# Altium footprint library E-Stall_lib.PcbLib: 112 footprints (part 4 of 7)
Each footprint in its own frame and in the unit in brackets; x right, y up, seen from the top. Pads: shape width x height; smd on the part's side, far side on the other; paste and mask are expansions set on the pad; w line width, h text height; cw(c..) or ccw(c..) is an arc to the next point about the centre after c.
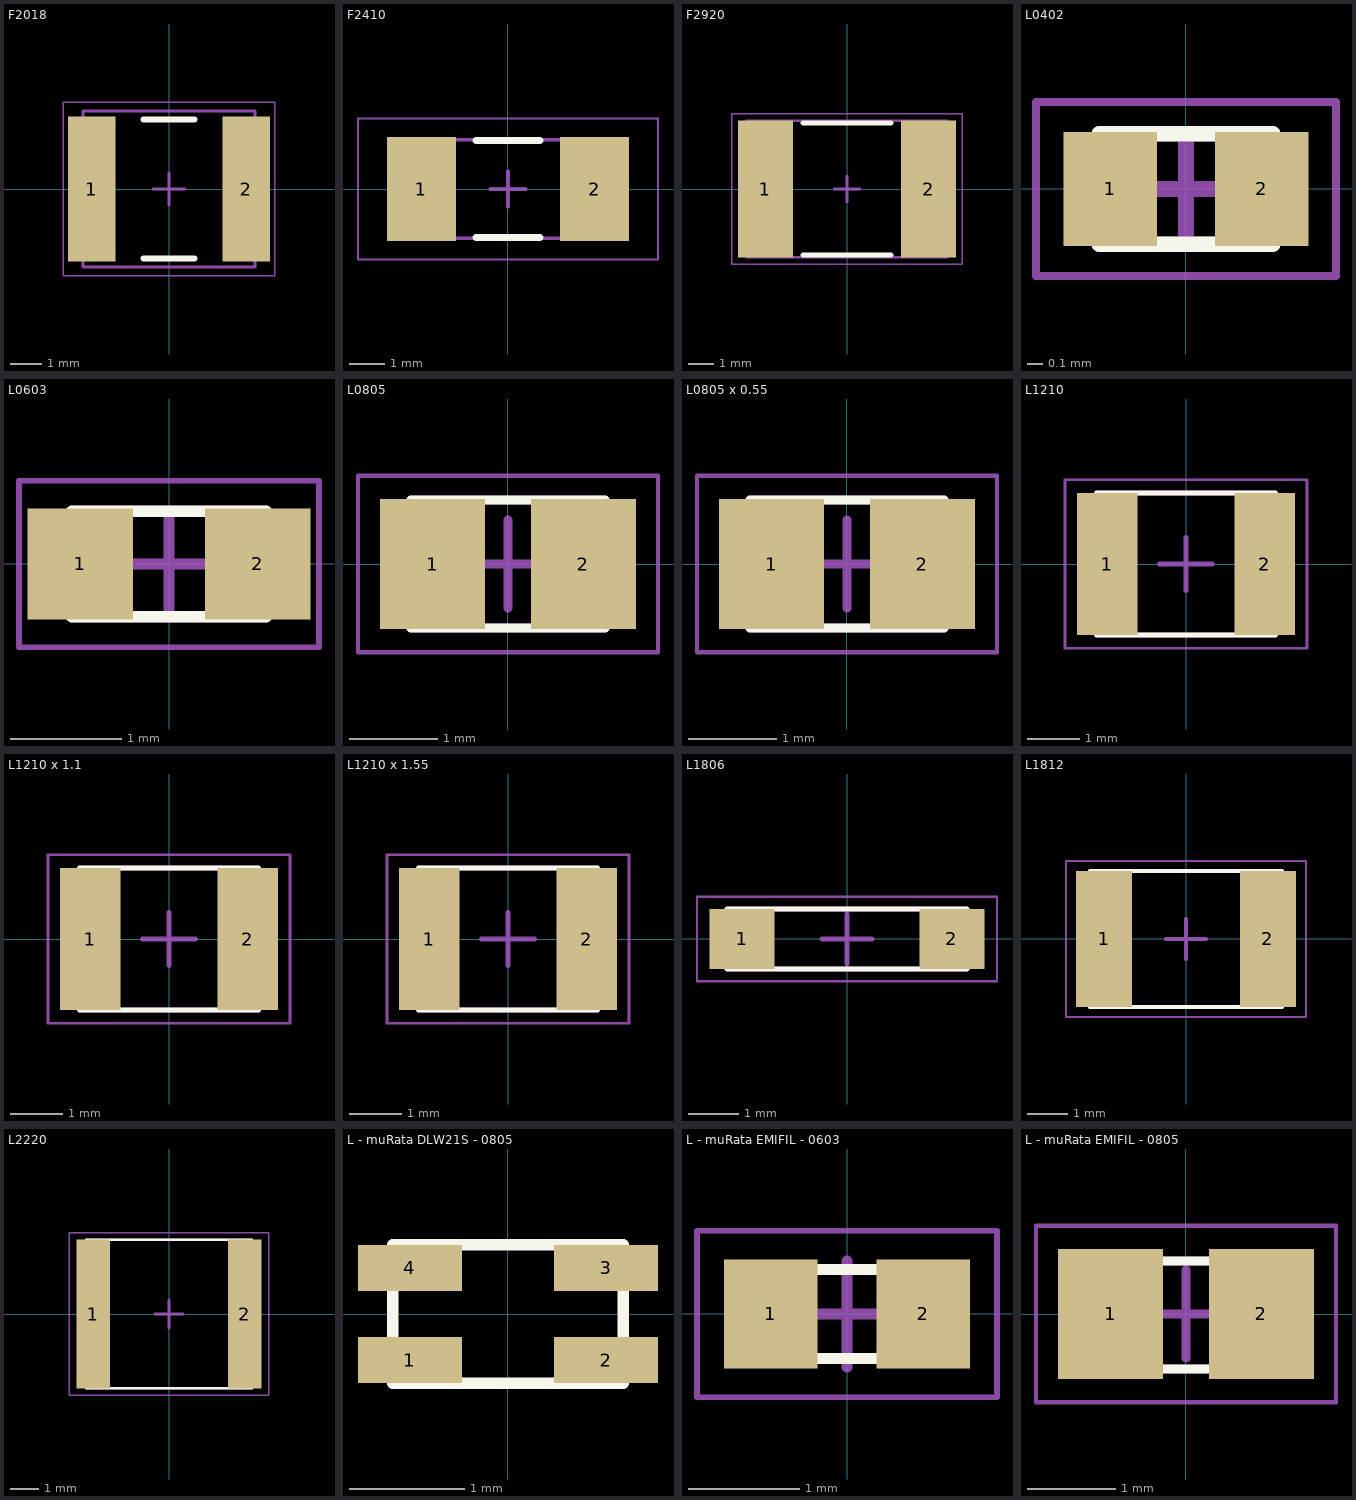
[diagram p3: the footprints below, top view; thin cyan lines are the x and y axes]

## F2018 [mm] "Chip Fuse, 2-Leads, Body 5,08x4,56mm, IPC Medium Density"
height 2
pads (2):
  rect 1.5x4.6 smd: 1(-2.45,0) 2(2.45,0)
Top Overlay:
  lines w0.2: -0.8,-2.2 0.8,-2.2 ; -0.8,2.2 0.8,2.2
Mechanical 13:
  lines w0.1: -2.72,-2.465 2.72,-2.465 2.72,2.465 -2.72,2.465 -2.72,-2.465
Mechanical 15:
  lines w0.05: -3.35,-2.75 3.35,-2.75 3.35,2.75 -3.35,2.75 -3.35,-2.75
  lines w0.1: -0.5,0 0.5,0 ; 0,-0.5 0,0.5
3D body "SMD_Polyfuse_2018.stp": height 0.59, standoff 0.01, extent -2.5,-2.3 2.5,2.3

## F2410 [mm] "Footprint für 2410 Sicherungen"
height 2.79
pads (2):
  rect 1.96x2.95 smd: 1(-2.455,0) 2(2.455,0)
Top Overlay:
  lines w0.2: -0.9,-1.375 0.9,-1.375 ; -0.9,1.375 0.9,1.375
Mechanical 1:
  lines w0.05: -4.25,-2 4.25,-2 4.25,2 -4.25,2 -4.25,-2
  lines w0.1: -0.5,0 0.5,0 ; 0,-0.5 0,0.5
Mechanical 13:
  lines w0.1: -3.175,-1.395 3.175,-1.395 3.175,1.395 -3.175,1.395 -3.175,-1.395
3D body "User Library-Fuse-2410.stp": height 2.54, standoff 0, extent -3.05,-1.27 3.05,1.27

## F2920 [mm] "Chip Fuse, 2-Leads, Body 7,36x5,12mm, IPC Medium Density"
height 1.7
pads (2):
  rect 2.2x5.45 smd: 1(-3.25,0) 2(3.25,0)
Top Overlay:
  lines w0.2: -1.75,-2.625 1.75,-2.625 ; -1.75,2.625 1.75,2.625
Mechanical 13:
  lines w0.1: -3.99,-2.72 3.99,-2.72 3.99,2.72 -3.99,2.72 -3.99,-2.72
Mechanical 15:
  lines w0.05: -4.6,-3 4.6,-3 4.6,3 -4.6,3 -4.6,-3
  lines w0.1: -0.5,0 0.5,0 ; 0,-0.5 0,0.5
3D body "SMD_Polyfuse_2920.stp": height 0.59, standoff 0.01, extent -3.65,-2.55 3.65,2.55

## L0402 [mm] "Chip Inductor, 2-Leads, Body 1,00x0,50mm, IPC Medium Density"
height 0.6
pads (2):
  rect 0.59x0.72 smd: 1(-0.48,0) 2(0.48,0)
Top Overlay:
  lines w0.1: -0.55,-0.35 -0.55,0.35 0.55,0.35 0.55,-0.35 -0.55,-0.35
Mechanical 13:
  lines w0.1: -0.55,-0.35 0.55,-0.35 0.55,0.35 -0.55,0.35 -0.55,-0.35
Mechanical 15:
  lines w0.05: -0.95,-0.55 0.95,-0.55 0.95,0.55 -0.95,0.55 -0.95,-0.55
  lines w0.1: -0.35,0 0.35,0 ; 0,-0.35 0,0.35
3D body "INDC1005X06N.step": height 0.6, standoff 0, extent -0.55,-0.35 0.55,0.35

## L0603 [mm] "Chip Inductor, 2-Leads, Body 1,60x0,80mm, IPC Medium Density"
height 0.8
pads (2):
  rect 0.95x1 smd: 1(-0.8,0) 2(0.8,0)
Top Overlay:
  lines w0.1: -0.875,-0.475 -0.875,0.475 0.875,0.475 0.875,-0.475 -0.875,-0.475
Mechanical 13:
  lines w0.1: -0.875,-0.475 -0.875,0.475 0.875,0.475 0.875,-0.475 -0.875,-0.475
Mechanical 15:
  lines w0.05: -1.35,-0.75 -1.35,0.75 1.35,0.75 1.35,-0.75 -1.35,-0.75
  lines w0.1: -0.475,0 0.475,0 ; 0,-0.475 0,0.475
3D body "INDC1608X08N.step": height 0.8, standoff 0, extent -0.875,-0.475 0.875,0.475

## L0805 [mm] "Chip Inductor, 2-Leads, Body 2,00x1,25mm, IPC Medium Density"
pads (2):
  rect 1.19x1.47 smd: 1(-0.855,0) 2(0.855,0)
Top Overlay:
  lines w0.1: -1.1,-0.725 1.1,-0.725 1.1,0.725 -1.1,0.725 -1.1,-0.725
Mechanical 13:
  lines w0.1: -1.1,-0.725 -1.1,0.725 1.1,0.725 1.1,-0.725 -1.1,-0.725
Mechanical 15:
  lines w0.05: -1.7,-1 -1.7,1 1.7,1 1.7,-1 -1.7,-1
  lines w0.1: -0.5,0 0.5,0 ; 0,-0.5 0,0.5
3D body "INDC2012X09N.step": height 0.95, standoff 0, extent -1.1,-0.725 1.1,0.725

## L0805 x 0.55 [mm] "Chip Inductor, 2-Leads, Body 2,00x1,25mm, IPC Medium Density"
height 0.55
pads (2):
  rect 1.19x1.47 smd: 1(-0.855,0) 2(0.855,0)
Top Overlay:
  lines w0.1: -1.1,-0.725 -1.1,0.725 1.1,0.725 1.1,-0.725 -1.1,-0.725
Mechanical 13:
  lines w0.1: -1.1,-0.725 1.1,-0.725 1.1,0.725 -1.1,0.725 -1.1,-0.725
Mechanical 15:
  lines w0.05: -1.7,-1 1.7,-1 1.7,1 -1.7,1 -1.7,-1
  lines w0.1: -0.5,0 0.5,0 ; 0,-0.5 0,0.5
3D body "INDC2012X10N.step": height 1, standoff 0, extent -1.1,-0.725 1.1,0.725

## L1210 [mm] "Chip Inductor, 2-Leads, Body 3,20x2,50mm, IPC Medium Density"
pads (2):
  rect 1.15x2.7 smd: 1(-1.5,0) 2(1.5,0)
Top Overlay:
  lines w0.1: -1.7,-1.35 1.7,-1.35 1.7,1.35 -1.7,1.35 -1.7,-1.35
Mechanical 13:
  lines w0.1: -1.7,-1.35 -1.7,1.35 1.7,1.35 1.7,-1.35 -1.7,-1.35
Mechanical 15:
  lines w0.05: -2.3,-1.6 -2.3,1.6 2.3,1.6 2.3,-1.6 -2.3,-1.6
  lines w0.1: -0.5,0 0.5,0 ; 0,-0.5 0,0.5
3D body "INDC3225X26N.step": height 2.57, standoff 0, extent -1.7,-1.35 1.7,1.35

## L1210 x 1.1 [mm] "Chip Inductor, 2-Leads, Body 3,20x2,50mm, IPC Medium Density"
height 1.1
pads (2):
  rect 1.15x2.7 smd: 1(-1.5,0) 2(1.5,0)
Top Overlay:
  lines w0.1: -1.7,-1.35 1.7,-1.35 1.7,1.35 -1.7,1.35 -1.7,-1.35
Mechanical 13:
  lines w0.1: -1.7,-1.35 -1.7,1.35 1.7,1.35 1.7,-1.35 -1.7,-1.35
Mechanical 15:
  lines w0.05: -2.3,-1.6 -2.3,1.6 2.3,1.6 2.3,-1.6 -2.3,-1.6
  lines w0.1: -0.5,0 0.5,0 ; 0,-0.5 0,0.5
3D body "INDC3225X26N.step": height 2.57, standoff 0, extent -1.7,-1.35 1.7,1.35

## L1210 x 1.55 [mm] "Chip Inductor, 2-Leads, Body 3,20x2,50mm, IPC Medium Density"
pads (2):
  rect 1.15x2.7 smd: 1(-1.5,0) 2(1.5,0)
Top Overlay:
  lines w0.1: -1.7,-1.35 -1.7,1.35 1.7,1.35 1.7,-1.35 -1.7,-1.35
Mechanical 13:
  lines w0.1: -1.7,-1.35 1.7,-1.35 1.7,1.35 -1.7,1.35 -1.7,-1.35
Mechanical 15:
  lines w0.05: -2.3,-1.6 2.3,-1.6 2.3,1.6 -2.3,1.6 -2.3,-1.6
  lines w0.1: -0.5,0 0.5,0 ; 0,-0.5 0,0.5
3D body "LQH32CN.STEP": height 2, standoff 0, extent -1.601,-1.355 1.601,1.355

## L1806 [mm] "Chip Inductor, 2-Leads, Body 4,50x0,90mm, IPC Medium Density"
height 1.9
pads (2):
  rect 1.3x1.2 smd: 1(-2.1,0) 2(2.1,0)
Top Overlay:
  lines w0.1: -2.4,-0.6 -2.4,0.6 2.4,0.6 2.4,-0.6 -2.4,-0.6
Mechanical 13:
  lines w0.1: -2.4,-0.6 2.4,-0.6 2.4,0.6 -2.4,0.6 -2.4,-0.6
Mechanical 15:
  lines w0.05: -3,-0.85 3,-0.85 3,0.85 -3,0.85 -3,-0.85
  lines w0.1: -0.5,0 0.5,0 ; 0,-0.5 0,0.5
3D body "INDC4509X19N.step": height 1.9, standoff 0, extent -2.4,-0.6 2.4,0.6

## L1812 [mm] "Chip Inductor, 2-Leads, Body 4,50x3,20mm, IPC Medium Density"
height 1.75
pads (2):
  rect 1.4x3.4 smd: 1(-2.05,0) 2(2.05,0)
Top Overlay:
  lines w0.1: -2.4,-1.7 2.4,-1.7 2.4,1.7 -2.4,1.7 -2.4,-1.7
Mechanical 13:
  lines w0.1: -2.4,-1.7 -2.4,1.7 2.4,1.7 2.4,-1.7 -2.4,-1.7
Mechanical 15:
  lines w0.05: -3,-1.95 -3,1.95 3,1.95 3,-1.95 -3,-1.95
  lines w0.1: -0.5,0 0.5,0 ; 0,-0.5 0,0.5
3D body "INDC4532X18N.step": height 1.75, standoff 0, extent -2.4,-1.7 2.4,1.7

## L2220 [mm] "Chip Inductor, 2-Leads, Body 5,70x5,00mm, IPC Medium Density"
height 1.8
pads (2):
  rect 1.2x5.3 smd: 1(-2.7,0) 2(2.7,0)
Top Overlay:
  lines w0.1: -2.95,-2.65 2.95,-2.65 2.95,2.65 -2.95,2.65 -2.95,-2.65
Mechanical 13:
  lines w0.1: -2.95,-2.65 -2.95,2.65 2.95,2.65 2.95,-2.65 -2.95,-2.65
Mechanical 15:
  lines w0.05: -3.55,-2.9 -3.55,2.9 3.55,2.9 3.55,-2.9 -3.55,-2.9
  lines w0.1: -0.5,0 0.5,0 ; 0,-0.5 0,0.5
3D body "INDC5750X18N.step": height 1.8, standoff 0, extent -2.95,-2.65 2.95,2.65

## L - muRata DLW21S - 0805 [mm]
height 1.2
pads (4):
  rect 0.9x0.4 smd: 1(-0.85,-0.4) 2(0.85,-0.4) 3(0.85,0.4) 4(-0.85,0.4)
Top Overlay:
  lines w0.1: -1,-0.6 0.975,-0.6 1,-0.6 1,0.6 -1,0.6 -1,-0.6
3D body "DLW21S.STEP": height 1.2, standoff 0, extent -1,-0.6 1,0.6

## L - muRata EMIFIL - 0603 [mm] "Chip Inductor, 2-Leads, Body 1,65x0,80mm, IPC Medium Density"
height 0.95
pads (2):
  rect 0.84x0.98 smd: 1(-0.685,0) 2(0.685,0)
Top Overlay:
  lines w0.1: -0.8,-0.4 -0.8,0.4 0.8,0.4 0.8,-0.4 -0.8,-0.4
Mechanical 13:
  lines w0.1: -0.8,-0.4 -0.8,0.4 0.8,0.4 0.8,-0.4 -0.8,-0.4
Mechanical 15:
  lines w0.05: -1.35,-0.75 1.35,-0.75 1.35,0.75 -1.35,0.75 -1.35,-0.75
  lines w0.1: -0.475,0 0.475,0 ; 0,-0.475 0,0.475
3D body "L - muRata EMIFIL - 0603.STEP": height 0.81, standoff 0.01, extent -0.8,-0.4 0.8,0.4

## L - muRata EMIFIL - 0805 [mm]
pads (2):
  rect 1.19x1.47 smd: 1(-0.855,0) 2(0.855,0)
Top Overlay:
  lines w0.1: -1,-0.625 -1,0.6 1,0.6 1,-0.625 -1,-0.625
Mechanical 13:
  lines w0.1: -1,-0.625 1,-0.625 1,0.6 -1,0.6 -1,-0.625
Mechanical 15:
  lines w0.05: -1.7,-1 1.7,-1 1.7,1 -1.7,1 -1.7,-1
  lines w0.1: -0.5,0 0.5,0 ; 0,-0.5 0,0.5
3D body "L - muRata - EMIFIL - 0805.STEP": height 0.95, standoff 0, extent -1,-0.6 1,0.6